# Altium footprint library PCB_GENERAL.PcbLib: 226 footprints (part 15 of 15)
Each footprint in its own frame and in the unit in brackets; x right, y up, seen from the top. Pads: shape width x height; smd on the part's side, far side on the other; paste and mask are expansions set on the pad; w line width, h text height; cw(c..) or ccw(c..) is an arc to the next point about the centre after c.
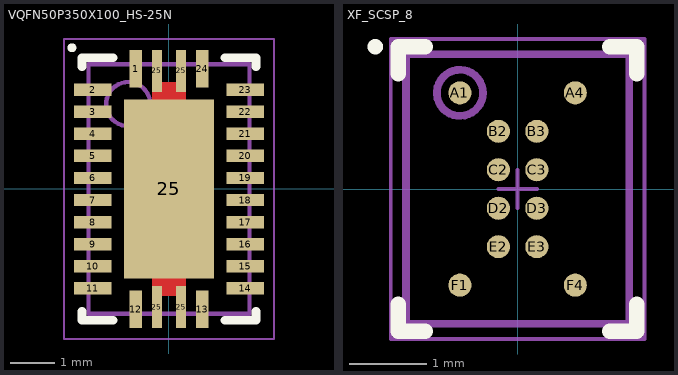
[diagram p14: the footprints below, top view; thin cyan lines are the x and y axes]

## VQFN50P350X100_HS-25N [mm] "VQFN, 25-Leads, Body 5,50x3,50mm, Pitch 0,50mm, Thermal Pad 4,05x1,94mm, IPC Medium Density"
height 1
pads (29):
  rect 0.28x0.85 smd: 1(-0.75,2.725) 12(-0.75,-2.725) 13(0.75,-2.725) 24(0.75,2.725)
  rect 0.85x0.28 smd: 2(-1.725,2.25) 3(-1.725,1.75) 4(-1.725,1.25) 5(-1.725,0.75) 6(-1.725,0.25) 7(-1.725,-0.25) 8(-1.725,-0.75) 9(-1.725,-1.25) 10(-1.725,-1.75) 11(-1.725,-2.25) 14(1.725,-2.25) 15(1.725,-1.75) 16(1.725,-1.25) 17(1.725,-0.75) 18(1.725,-0.25) 19(1.725,0.25) 20(1.725,0.75) 21(1.725,1.25) 22(1.725,1.75) 23(1.725,2.25)
  rect 0.23x0.95 smd: 25(-0.275,-2.675) 25(-0.275,2.675) 25(0.275,-2.675) 25(0.275,2.675)
  rect 2.05x4.05 smd paste-5: 25(0,0)
Top Layer:
  region: 0.39,-1.9 -0.39,-1.9 -0.39,-2.425 0.39,-2.425
  rectangle: -0.39,1.9 0.39,2.425
Top Overlay:
  circle w0.1: c-2.2,3.2 r0.05
  lines w0.2: -1.975,-2.775 -1.975,-2.975 -1.27,-2.975 ; -1.975,2.775 -1.975,2.975 -1.27,2.975 ; 1.27,-2.975 1.975,-2.975 1.975,-2.775 ; 1.27,2.975 1.975,2.975 1.975,2.775
Top Paste:
  region: 0.95,1.95 0.13,1.95 0.13,0.85 0.95,0.85
  rectangle: -0.95,-1.95 -0.13,-0.85
  region: 0.95,-0.85 0.13,-0.85 0.13,-1.95 0.95,-1.95
  rectangle: -0.95,0.85 -0.13,1.95
  region: 0.95,0.55 0.13,0.55 0.13,-0.55 0.95,-0.55
  rectangle: -0.95,-0.55 -0.13,0.55
Mechanical 11:
  text ".Designator" at -0.03,-0.13 h1
Mechanical 14:
  circle w0.1: c-0.925,1.925 r0.5
  lines w0.1: -1.825,-2.825 1.825,-2.825 1.825,2.825 -1.825,2.825 -1.825,-2.825
Mechanical 15:
  lines w0.05: -0.5,0 0.5,0 ; 0,-0.5 0,0.5 ; -2.38,-3.4 2.38,-3.4 2.38,3.4 -2.38,3.4 -2.38,-3.4
3D body: height 1, standoff 0, extent -1.825,-2.825 1.825,2.825

## XF_SCSP_8 [mm] "XF-SCSP-8 BGA, 2.93 x 3.5 mm"
height 0.41
pads (12):
  round 0.3 smd: A1(-0.75,1.25) A4(0.75,1.25) B2(-0.25,0.75) B3(0.25,0.75) C2(-0.25,0.25) C3(0.25,0.25) D2(-0.25,-0.25) D3(0.25,-0.25) E2(-0.25,-0.75) E3(0.25,-0.75) F1(-0.75,-1.25) F4(0.75,-1.25)
Top Overlay:
  circle w0.1: c-1.85,1.85 r0.05
  lines w0.2: -1.55,-1.5 -1.55,-1.85 -1.2,-1.85 ; -1.55,1.5 -1.55,1.85 -1.2,1.85 ; 1.2,-1.85 1.55,-1.85 1.55,-1.5 ; 1.2,1.85 1.55,1.85 1.55,1.5
Mechanical 11:
  text ".Designator" at -0.85,-0.275 h1
Mechanical 14:
  circle w0.1: c-0.75,1.25 r0.3
  lines w0.1: -1.45,-1.75 1.45,-1.75 1.45,1.75 -1.45,1.75 -1.45,-1.75
Mechanical 15:
  lines w0.05: -0.25,0 0.25,0 ; 0,-0.25 0,0.25 ; -1.65,-1.95 1.65,-1.95 1.65,1.95 -1.65,1.95 -1.65,-1.95
3D body: height 0.41, standoff 0.05, extent -1.45,-1.75 1.45,1.75